# Altium footprint library Components.PcbLib: 139 footprints (part 7 of 9)
Each footprint in its own frame and in the unit in brackets; x right, y up, seen from the top. Pads: shape width x height; smd on the part's side, far side on the other; paste and mask are expansions set on the pad; w line width, h text height; cw(c..) or ccw(c..) is an arc to the next point about the centre after c.
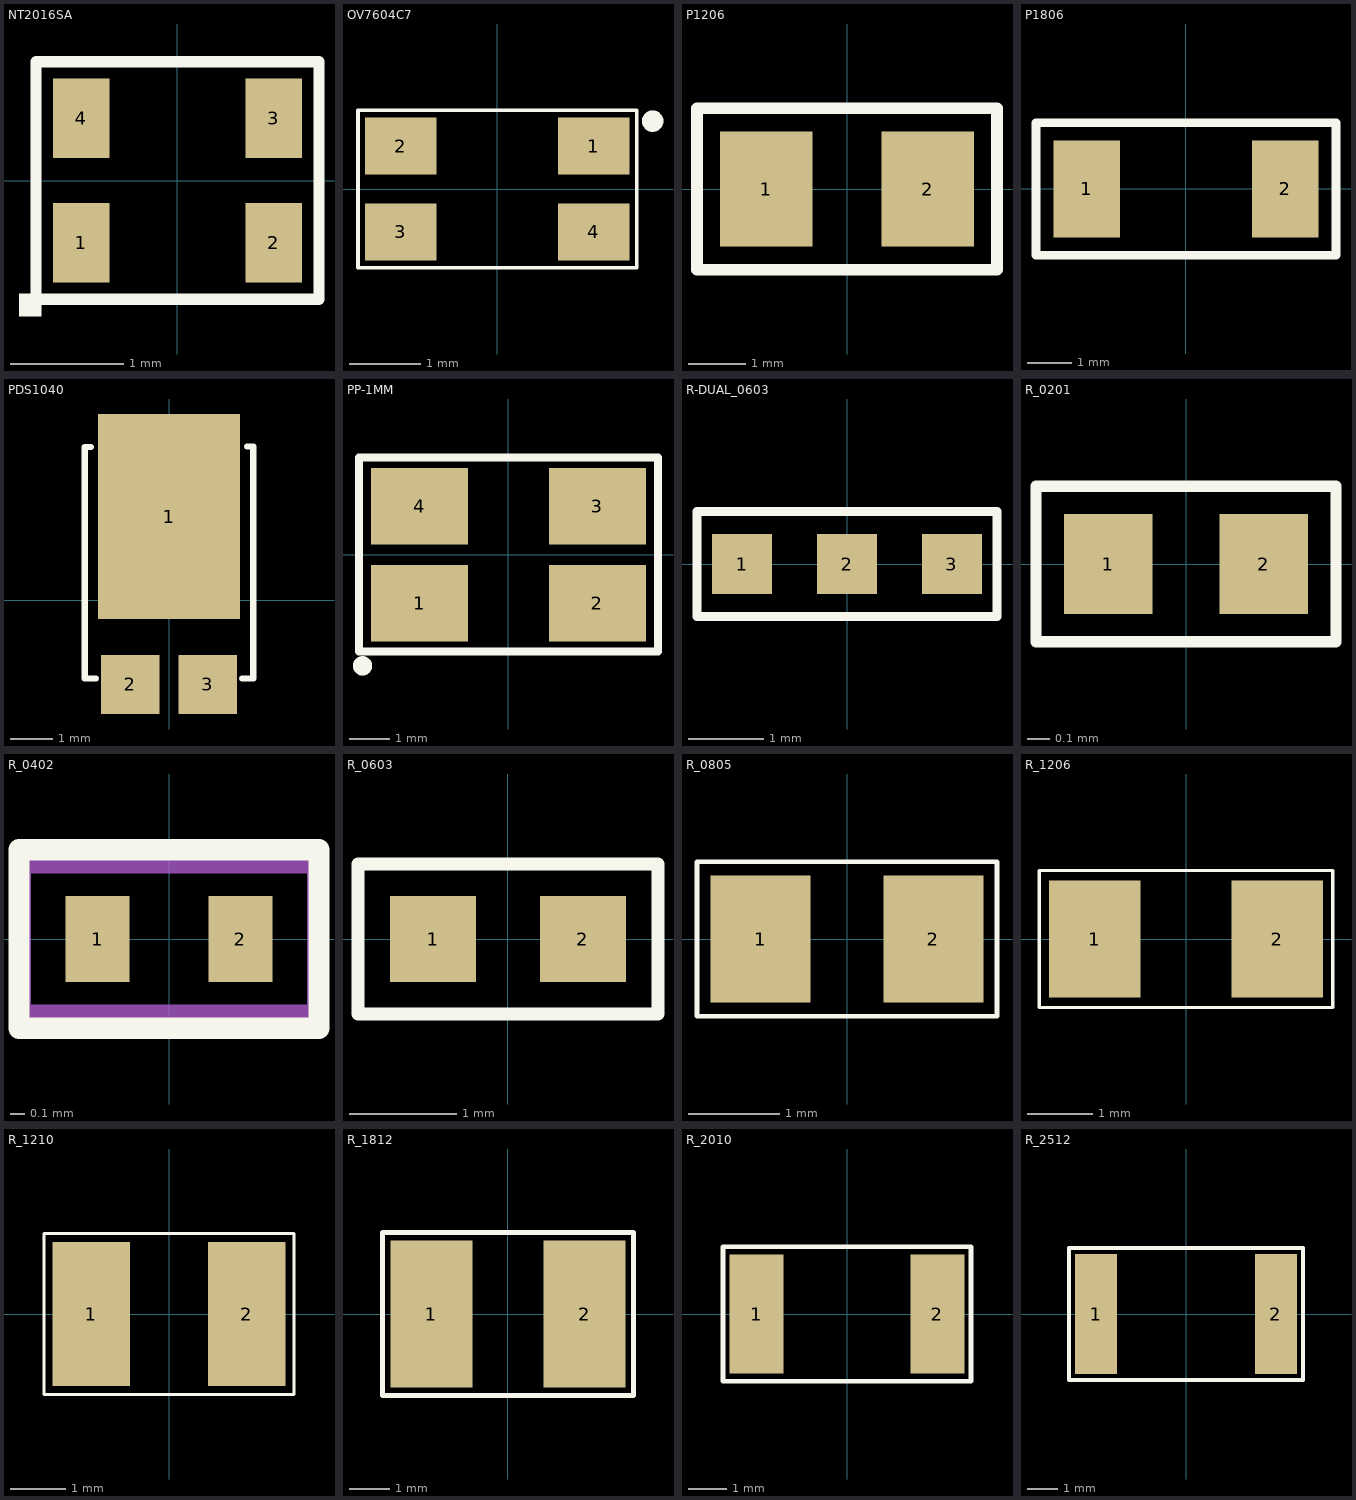
[diagram p6: the footprints below, top view; thin cyan lines are the x and y axes]

## NT2016SA [mm]
pads (4):
  rect 0.5x0.7 smd paste-0.05 mask+0.08: 1(-0.85,-0.55) 2(0.85,-0.55) 3(0.85,0.55) 4(-0.85,0.55)
Top Overlay:
  rectangle: -1.4,-1.2 -1.2,-1
  lines w0.1: -1.25,-1.05 -1.25,1.05 1.25,1.05 1.25,-1.05 -1.25,-1.05
3D body: height 0.8, standoff 0, extent -1,-0.8 1,0.8

## OV7604C7 [mm]
pads (4):
  rect 1x0.8 smd paste-0.08 mask+0.05: 1(1.35,0.6) 2(-1.35,0.6) 3(-1.35,-0.6) 4(1.35,-0.6)
Top Overlay:
  circle w0.15: c2.175,0.95 r0.075
  lines w0.05: -1.95,-1.1 -1.95,1.1 1.95,1.1 1.95,-1.1 -1.95,-1.1

## P1206 [mm]
pads (2):
  rect 1.6x2 smd paste-0.15 mask+0.1: 1(-1.4,0) 2(1.4,0)
Top Overlay:
  lines w0.2: -2.6,-1.4 2.6,-1.4 2.6,1.4 -2.6,1.4 -2.6,1 -2.6,-1.4
3D body "User Library-Chip Resistor2.STEP": height 0.84, standoff 0, extent -1.6,-0.8 1.6,0.8

## P1806 [mm]
pads (2):
  rect 1.5x2.2 smd paste-0.12 mask+0.1: 1(-2.25,0) 2(2.25,0)
Top Overlay:
  lines w0.2: -3.4,-1.5 -3.4,1.5 3.4,1.5 3.4,-1.5 -3.4,-1.5
3D body "SW3dPS-1806.STEP": height 1.4, standoff 0, extent -2.25,-0.8 2.246,0.8

## PDS1040 [mm]
pads (3):
  rect 3.36x4.86 smd paste-0.5 mask+0.1: 1(0,1.991)
  rect 1.39x1.4 smd paste-0.18 mask+0.05: 2(-0.92,-1.991) 3(0.92,-1.991)
Top Overlay:
  lines w0.15: -1.85,3.64 -2,3.64 -2,-1.85 -1.73,-1.85 ; 1.73,-1.85 2,-1.85 2,3.65 1.85,3.65
3D body "User Library-PDS 1040.step": height 3.25, standoff -3.25, extent -1270.62,-1267.192 -1266.62,-1266.091
3D body "User Library-PDS 1040.step": height 1.1, standoff 0, extent -2,-2.35 2,4.15

## PP-1MM [mm]
pads (4):
  rect 2.4x1.9 smd paste-0.2: 1(-2.2,-1.2) 2(2.2,-1.2) 3(2.2,1.2) 4(-2.2,1.2)
Top Overlay:
  circle w0.254: c-3.612,-2.75 r0.112
  lines w0.2: -3.7,-2.4 -3.7,2.4 3.7,2.4 3.7,-2.4 -3.7,-2.4
3D body: height 1.2, standoff 0, extent -3.063,-1.813 3.064,1.814

## R-DUAL_0603 [mm]
pads (3):
  rect 0.8x0.8 smd paste-0.06 mask+0.08: 1(-1.4,0) 2(0,0) 3(1.4,0)
Top Overlay:
  lines w0.12: -2,-0.7 2,-0.7 2,0.7 -2,0.7 -2,-0.7
3D body: height 1, standoff 0, extent -1.499,-0.399 1.499,0.399

## R_0201 [mm]
pads (2):
  rect 0.4x0.45 smd paste-0.04 mask+0.03: 1(-0.35,0) 2(0.35,0)
Top Overlay:
  lines w0.05: -0.675,-0.35 -0.675,0.35 0.675,0.35 0.675,-0.35 -0.675,-0.35
3D body "User Library-SMD RESISTOR-1.step": height 0.22, standoff -0.02, extent -0.3,-0.15 0.3,0.15

## R_0402 [mm]
pads (2):
  rect 0.45x0.6 smd paste-0.04 mask+0.05: 1(-0.5,0) 2(0.5,0)
Top Overlay:
  lines w0.15: -1.05,-0.625 1.05,-0.625 1.05,0.625 -1.05,0.625 -1.05,0 -1.05,-0.625
Mechanical 29:
  lines w0.1: -1.016,-0.508 1.016,-0.508 1.016,0.508 -1.016,0.508 -1.016,-0.508
  text ".Designator" at -0.889,-0.254 h0.5
3D body "SW3dPS-0402 SMD Resistor.STEP": height 0.2, standoff 0, extent -0.5,-0.3 0.5,0.3

## R_0603 [mm]
pads (2):
  rect 0.8x0.8 smd paste-0.04 mask+0.05: 1(-0.7,0) 2(0.7,0)
Top Overlay:
  lines w0.12: -1.4,-0.7 -1.4,0 -1.4,0.7 1.4,0.7 1.4,-0.7 -1.4,-0.7
3D body "SW3dPS-0603 SMD Resistor.STEP": height 0.3, standoff 0, extent -0.8,-0.4 0.8,0.4

## R_0805 [mm]
pads (2):
  rect 1.1x1.4 smd paste-0.1 mask+0.05: 1(-0.95,0) 2(0.95,0)
Top Overlay:
  lines w0.05: -1.65,-0.85 1.65,-0.85 1.65,0.85 -1.65,0.85 -1.65,-0.85
3D body "User Library-SMD RESISTOR-1(3).step": height 0.6, standoff 0, extent -1,-0.6 1,0.65

## R_1206 [mm]
pads (2):
  rect 1.4x1.8 smd paste-0.1 mask+0.05: 1(-1.4,0) 2(1.4,0)
Top Overlay:
  lines w0.05: -2.25,-1.05 2.25,-1.05 2.25,1.05 -2.25,1.05 -2.25,-1.05
3D body "User Library-SMD RESISTOR-1(4).step": height 0.6, standoff 0, extent -1.6,-0.8 1.6,0.8

## R_1210 [mm]
pads (2):
  rect 1.4x2.6 smd paste-0.1 mask+0.05: 1(-1.4,0) 2(1.4,0)
Top Overlay:
  lines w0.05: -2.25,-1.45 2.25,-1.45 2.25,1.45 -2.25,1.45 -2.25,-1.45
3D body "User Library-RESC3225X06N.step": height 0.55, standoff 0, extent -1.55,-1.3 1.65,1.2

## R_1812 [mm]
pads (2):
  rect 2x3.6 smd paste-0.2 mask+0.1: 1(-1.875,0) 2(1.875,0)
Top Overlay:
  lines w0.12: -3.075,-2 3.075,-2 3.075,2 -3.075,2 -3.075,-2
3D body "SW3dPS-1812 SMD Resistor.STEP": height 1.7, standoff 0.1, extent -2.25,-1.6 2.25,1.6

## R_2010 [mm]
pads (2):
  rect 1.4x3.1 smd paste-0.2 mask+0.1: 1(-2.35,0) 2(2.35,0)
Top Overlay:
  lines w0.12: -3.225,-1.75 3.225,-1.75 3.225,1.75 -3.225,1.75 -3.225,-1.75
3D body "User Library-Chip Resistor_2010 (5025).step": height 0.66, standoff 0.1, extent -2.475,-1.302 2.525,1.2

## R_2512 [mm]
pads (2):
  rect 1.4x4 smd paste-0.2 mask+0.1: 1(-3,0) 2(3,0)
Top Overlay:
  lines w0.12: -3.9,-2.2 -3.9,2.2 3.9,2.2 3.9,-2.2 -3.9,-2.2
3D body "User Library-res2512_body.step": height 0.72, standoff 0.1, extent -3.159,-1.6 3.16,1.6